# Altium footprint library Разъемы.PcbLib: 291 footprints (part 12 of 19)
Each footprint in its own frame and in the unit in brackets; x right, y up, seen from the top. Pads: shape width x height; smd on the part's side, far side on the other; paste and mask are expansions set on the pad; w line width, h text height; cw(c..) or ccw(c..) is an arc to the next point about the centre after c.
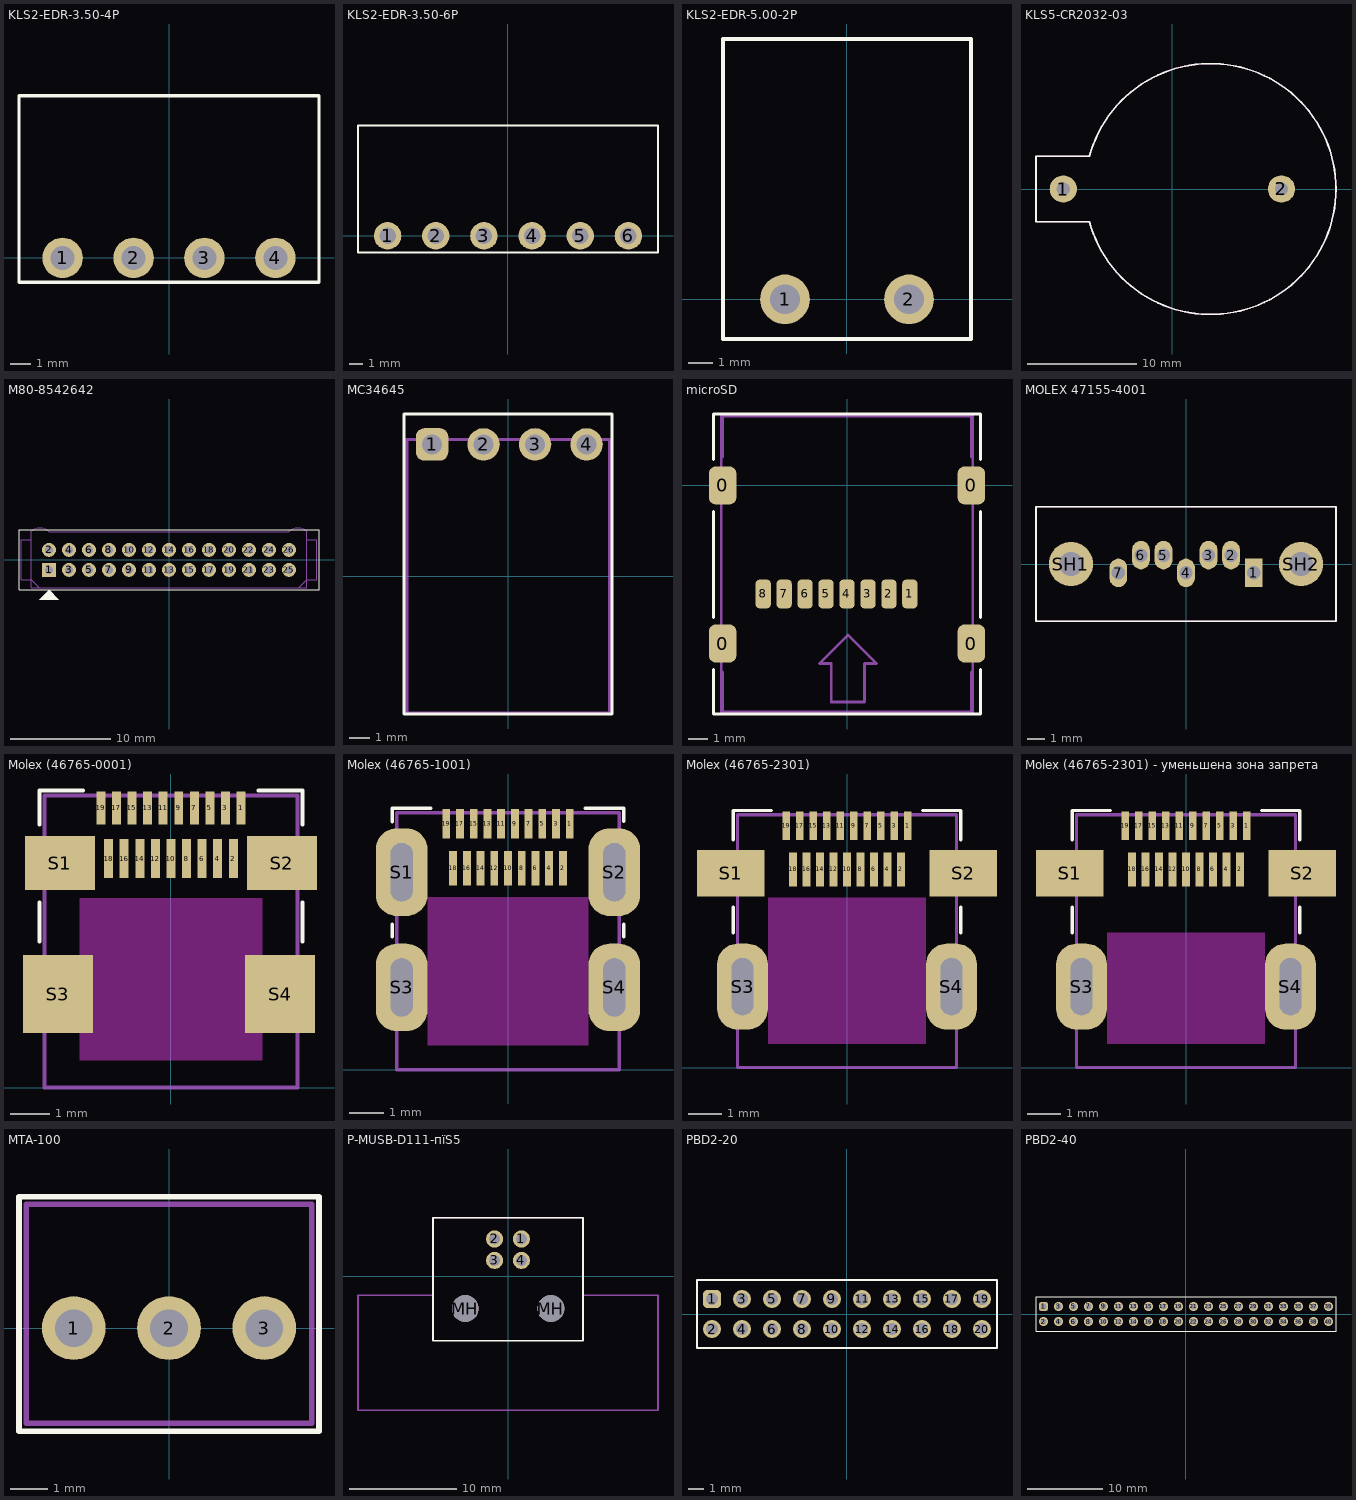
[diagram p11: the footprints below, top view; thin cyan lines are the x and y axes]

## KLS2-EDR-3.50-4P [mm]
pads (4):
  round 2 hole 1.2: 1(-5.25,0) 2(-1.75,0) 3(1.75,0) 4(5.25,0)
Top Overlay:
  lines w0.15: -7.4,-1.2 -7.4,8 -7,8 7.4,8 7.4,-1.2 -7,-1.2 -7.4,-1.2
3D body: height 7, standoff 0, extent -7.4,-1.2 7.4,8

## KLS2-EDR-3.50-6P [mm]
pads (6):
  round 2 hole 1.2: 1(-8.75,0) 2(-5.25,0) 3(-1.75,0) 4(1.75,0) 5(5.25,0) 6(8.75,0)
Top Overlay:
  lines w0.15: 10.85,-1.2 -7,-1.2 -10.9,-1.2 -10.9,8 -7,8 10.85,8 ; 10.9,-1.2 10.9,8
3D body: height 7, standoff 0, extent -10.9,-1.2 10.85,8

## KLS2-EDR-5.00-2P [mm]
pads (2):
  round 2 hole 1.2: 1(-2.5,0) 2(2.5,0)
Top Overlay:
  lines w0.15: -5,-1.6 0.4,-1.6 5,-1.6 5,10.5 -2.5,10.5 -5,10.5 -5,-1.6
3D body: height 8.2, standoff 0, extent -5,-1.6 5,10.5

## KLS5-CR2032-03 [mm]
height 6.6
pads (2):
  round 2.5 hole 1.2: 1(-10,0) 2(10,0)
Top Overlay:
  lines w0.15: -7.621,-3 -12.5,-3 -12.5,0 -12.5,3 -7.621,3 -7.595,3.026 cw(c3.5,0) -7.595,-3.026
Top Courtyard:
  lines w0.15: -7.621,-3 -12.5,-3 -12.5,0 -12.5,3 -7.621,3 -7.595,3.026 cw(c3.5,0) -7.595,-3.026
3D body: height 6, standoff 0, extent -12.5,-3 -5.5,3
3D body: height 6, standoff 0, extent -8,-11.5 15,11.5

## M80-8542642 [mm] "Harwin"
height 5.56
pads (26):
  rect 1.4x1.4 hole 0.8: 1(-12,-1)
  round 1.4 hole 0.8: 2(-12,1) 3(-10,-1) 4(-10,1) 5(-8,-1) 6(-8,1) 7(-6,-1) 8(-6,1) 9(-4,-1) 10(-4,1) 11(-2,-1) 12(-2,1) 13(0,-1) 14(0,1) 15(2,-1) 16(2,1) 17(4,-1) 18(4,1) 19(6,-1) 20(6,1) 21(8,-1) 22(8,1) 23(10,-1) 24(10,1) 25(12,-1) 26(12,1)
Top Overlay:
  region: -12,-3 -13,-4 -11,-4
  lines w0.1: -15,-3 -15,3 15,3 15,-3 -15,-3
Mechanical 1:
  lines w0.1: -13.8,2 -14.775,2 -14.775,-2 -13.8,-2 -13,-2.8 ; 13,-2.8 13.8,-2 14.775,-2 14.775,2 13.8,2 ; -13.8,-2.8 -13.8,2.8 cw(c-12.9,1.9) -12,2.8 12,2.8 cw(c12.9,1.9) 13.8,2.8 13.8,-2.8 -13.8,-2.8
3D body "M80-8542642 (Harwin).STEP": height 5.56, standoff -3, extent -14.775,-2.8 14.775,3.1

## MC34645 [mm] "MULTICOMP, Wire-To-Board Connector, 2.54 mm, 4 Contacts, Header, MC34 Series, Through Hole, 1 Rows"
height 5.8
pads (4):
  rrect50% 1.6x1.6 hole 1: 1(-3.75,6.5)
  round 1.6 hole 1: 2(-1.21,6.5) 3(1.33,6.5) 4(3.87,6.5)
Top Overlay:
  lines w0.15: -5.13,-6.8 -5.13,8 5.12,8 5.12,-6.8 -5.13,-6.8
Top Courtyard:
  lines w0.15: -5,-6.75 -5,6.75 5,6.75 5,-6.75 -5,-6.75
Top Designator:
  text ".Designator" at -4.004,0.333 h0.8
3D body "STEP-61900411021-rev1.stp": height 5.9, standoff -3.3, extent -5.02,-6.685 5.14,6.835

## microSD [mm]
height 2
pads (12):
  rrect50% 1.45x2 smd: 0(-6.53,-8.3) 0(-6.53,0) 0(6.53,-8.3) 0(6.53,0)
  rrect50% 0.8x1.5 smd: 1(3.3,-5.7) 2(2.2,-5.7) 3(1.1,-5.7) 4(0,-5.7) 5(-1.1,-5.7) 6(-2.2,-5.7) 7(-3.3,-5.7) 8(-4.4,-5.7)
Top Overlay:
  lines w0.15: -7,-9.669 -7,-12 7,-12 7,-9.669 ; -7,-6.931 -7,-1.369 ; -7,1.369 -7,3.75 7,3.75 7,1.369 ; 7,-6.931 7,-1.369
Top Designator:
  text ".Designator" at -3.999,-4.392 h0.8
Mechanical 29:
  lines w0.15: -6.53,-9.8 -6.53,-11.95 0,-11.95 6.53,-11.95 6.53,-9.8 ; -6.53,1.5 -6.53,3.65 0,3.65 6.53,3.65 6.53,1.5 ; -6.6,-11.9 6.6,-11.9 6.6,1.5 6.6,3.7 -6.6,3.7 -6.6,1.5 -6.6,-11.9 ; -1.45,-9.35 0.05,-7.85 1.55,-9.35 0.925,-9.35 0.925,-11.375 0.05,-11.375 -0.825,-11.375 -0.825,-9.35 -1.45,-9.35
  text ".Designator" at -4,-2.3 h1
3D body "User Library-473521001_microSD.step": height 2, standoff 0.12, extent -7.1,-11.915 7,3.285

## MOLEX 47155-4001 [mm] "MOLEX 47155-4001 (SATA)"
height 8.4
pads (9):
  rect 1x1.6 hole 0.75: 1(3.81,-0.5)
  oval 1x1.6 hole 0.75: 2(2.54,0.5) 3(1.27,0.5) 4(0,-0.5) 5(-1.27,0.5) 6(-2.54,0.5) 7(-3.81,-0.5)
  round 2.5 hole 1.35: SH1(-6.48,0) SH2(6.48,0)
Top Overlay:
  lines w0.1: -8.45,-3.225 -8.45,3.225 8.45,3.225 8.45,-3.225 -8.45,-3.225
Mechanical 1:
  lines w0.1: -8.45,-3.225 -8.45,3.225 8.45,3.225 8.45,-3.225 -8.45,-3.225
3D body "471554001.stp": height 8.65, standoff -2.4, extent -8.45,-3.171 8.45,3.279

## Molex (46765-0001) [mm]
height 3.05
pads (23):
  rect 0.23x0.85 smd: 1(1.8,7.175) 3(1.4,7.175) 5(1,7.175) 7(0.6,7.175) 9(0.2,7.175) 11(-0.2,7.175) 13(-0.6,7.175) 15(-1,7.175) 17(-1.4,7.175) 19(-1.8,7.175)
  rect 0.23x1 smd: 2(1.6,5.875) 4(1.2,5.875) 6(0.8,5.875) 8(0.4,5.875) 10(0,5.875) 12(-0.4,5.875) 14(-0.8,5.875) 16(-1.2,5.875) 18(-1.6,5.875)
  rect 1.8x1.38 smd: S1(-2.85,5.76) S2(2.85,5.76)
  rect 1.8x2 smd: S3(-2.9,2.4) S4(2.8,2.4)
Top Overlay:
  lines w0.1: -3.375,3.75 -3.375,4.75 ; -3.375,6.75 -3.375,7.625 -2.25,7.625 ; 2.25,7.625 3.375,7.625 3.375,6.75 ; 3.375,3.75 3.375,4.75
Keep-Out Layer:
  rectangle: -2.35,0.7 2.35,4.86
Mechanical 1:
  lines w0.1: -3.25,0 -3.25,7.5 3.25,7.5 3.25,0 -3.25,0
3D body "467650001.stp": height 2.92, standoff -0.05, extent -3.25,0 3.25,7.5

## Molex (46765-1001) [mm]
height 3.05
pads (23):
  rect 0.23x0.85 smd: 1(1.8,7.175) 3(1.4,7.175) 5(1,7.175) 7(0.6,7.175) 9(0.2,7.175) 11(-0.2,7.175) 13(-0.6,7.175) 15(-1,7.175) 17(-1.4,7.175) 19(-1.8,7.175)
  rect 0.23x1 smd: 2(1.6,5.875) 4(1.2,5.875) 6(0.8,5.875) 8(0.4,5.875) 10(0,5.875) 12(-0.4,5.875) 14(-0.8,5.875) 16(-1.2,5.875) 18(-1.6,5.875)
  rrect80% 1.5x2.55 hole 0.65 slot 1.7 at 90 deg: S1(-3.1,5.76) S2(3.1,5.76) S3(-3.1,2.4) S4(3.1,2.4)
Top Overlay:
  lines w0.1: -3.375,3.875 -3.375,4.25 ; -3.375,7.225 -3.375,7.625 -2.25,7.625 ; 2.25,7.625 3.375,7.625 3.375,7.25 ; 3.375,3.875 3.375,4.25
Keep-Out Layer:
  rectangle: -2.35,0.7 2.35,5.04
Mechanical 1:
  lines w0.1: -3.25,0 -3.25,7.5 3.25,7.5 3.25,0 -3.25,0
3D body "467651001.stp": height 2.92, standoff -0.6, extent -3.25,0 3.25,7.5

## Molex (46765-2301) [mm]
height 3.05
pads (23):
  rect 0.23x0.85 smd: 1(1.8,7.175) 3(1.4,7.175) 5(1,7.175) 7(0.6,7.175) 9(0.2,7.175) 11(-0.2,7.175) 13(-0.6,7.175) 15(-1,7.175) 17(-1.4,7.175) 19(-1.8,7.175)
  rect 0.23x1 smd: 2(1.6,5.875) 4(1.2,5.875) 6(0.8,5.875) 8(0.4,5.875) 10(0,5.875) 12(-0.4,5.875) 14(-0.8,5.875) 16(-1.2,5.875) 18(-1.6,5.875)
  rect 2x1.38 smd: S1(-3.45,5.76) S2(3.45,5.76)
  rrect80% 1.5x2.55 hole 0.65 slot 1.7 at 90 deg: S3(-3.1,2.4) S4(3.1,2.4)
Top Overlay:
  lines w0.1: -3.375,4 -3.375,4.75 ; -3.375,6.75 -3.375,7.625 -2.25,7.625 ; 2.25,7.625 3.375,7.625 3.375,6.75 ; 3.375,4 3.375,4.75
Keep-Out Layer:
  rectangle: -2.35,0.7 2.35,5.04
Mechanical 1:
  lines w0.1: -3.25,0 -3.25,7.5 3.25,7.5 3.25,0 -3.25,0
3D body "467652301.stp": height 2.92, standoff -0.6, extent -4.45,0 4.45,7.5

## Molex (46765-2301) - уменьшена зона запрета [mm]
height 3.05
pads (23):
  rect 0.23x0.85 smd: 1(1.8,7.175) 3(1.4,7.175) 5(1,7.175) 7(0.6,7.175) 9(0.2,7.175) 11(-0.2,7.175) 13(-0.6,7.175) 15(-1,7.175) 17(-1.4,7.175) 19(-1.8,7.175)
  rect 0.23x1 smd: 2(1.6,5.875) 4(1.2,5.875) 6(0.8,5.875) 8(0.4,5.875) 10(0,5.875) 12(-0.4,5.875) 14(-0.8,5.875) 16(-1.2,5.875) 18(-1.6,5.875)
  rect 2x1.38 smd: S1(-3.45,5.76) S2(3.45,5.76)
  rrect80% 1.5x2.55 hole 0.65 slot 1.7 at 90 deg: S3(-3.1,2.4) S4(3.1,2.4)
Top Overlay:
  lines w0.1: -3.375,4 -3.375,4.75 ; -3.375,6.75 -3.375,7.625 -2.25,7.625 ; 2.25,7.625 3.375,7.625 3.375,6.75 ; 3.375,4 3.375,4.75
Keep-Out Layer:
  rectangle: -2.35,0.7 2.35,4
Mechanical 1:
  lines w0.1: -3.25,0 -3.25,7.5 3.25,7.5 3.25,0 -3.25,0
3D body "467652301.stp": height 2.92, standoff -0.6, extent -4.45,0 4.45,7.5

## MTA-100 [mm] "MTA-100 3 pins"
height 10
pads (3):
  round 1.7 hole 1: 1(-2.54,0) 2(0,0) 3(2.54,0)
Top Overlay:
  lines w0.15: -4,-2.75 4,-2.75 4,3.5 -4,3.5 -4,-2.75
Top Designator:
  text ".Designator" at -3.719,0.114 h0.8
Mechanical 29:
  lines w0.15: -3.81,-2.54 3.81,-2.54 ; -3.81,-2.54 -3.81,3.302 ; -3.81,-2.54 3.81,-2.54 ; -3.81,-2.54 -3.81,3.302 ; -3.81,3.302 3.81,3.302 ; -3.81,3.302 3.81,3.302 ; 3.81,-2.54 3.81,3.302 ; 3.81,-2.54 3.81,3.302
  text ".Designator" at -3,0.2 h1

## P-MUSB-D111-пїЅ5 [mm]
height 13
pads (6):
  round 1.6 hole 1: 1(1.25,3.5) 2(-1.25,3.5) 3(-1.25,1.5) 4(1.25,1.5)
  round 2.5 hole 2.5 unplated: MH(-4,-2.99) MH(4,-2.99)
Top Overlay:
  lines w0.15: -7,-6 -7,5.5 0,5.5 7,5.5 7,-6 0,-6 -7,-6
Top Courtyard:
  lines w0.15: -14,-12.5 0,-12.5 14,-12.5 14,-1.74 7,-1.74 7,5.5 0,5.5 -7,5.5 -7,-1.74 -14,-1.74 -14,-12.5
Top Designator:
  text ".Designator" at -3.999,-3.767 h0.8
3D body "P-MUSB-D111-�5.STEP": height 15.6, standoff -2.65, extent -14,-12.5 14,5.5

## PBD2-20 [mm]
pads (20):
  rrect50% 1.2x1.2 hole 0.8: 1(-9,1)
  round 1.2 hole 0.8: 2(-9,-1) 3(-7,1) 4(-7,-1) 5(-5,1) 6(-5,-1) 7(-3,1) 8(-3,-1) 9(-1,1) 10(-1,-1) 11(1,1) 12(1,-1) 13(3,1) 14(3,-1) 15(5,1) 16(5,-1) 17(7,1) 18(7,-1) 19(9,1) 20(9,-1)
Top Overlay:
  lines w0.15: -10,-2.27 10,-2.27 10,2.27 -10,2.27 -10,-2.27
  text "." at -10.5,1.5 h0.1
3D body: height 4.3, standoff 0, extent -10,-2 10,2
3D body: height 1, standoff -3, extent -9.25,0.75 -8.75,1.25
3D body: height 1, standoff -3, extent -9.25,-1.25 -8.75,-0.75
3D body: height 1, standoff -3, extent -7.25,0.75 -6.75,1.25
3D body: height 1, standoff -3, extent -7.25,-1.25 -6.75,-0.75
3D body: height 1, standoff -3, extent -5.25,0.75 -4.75,1.25
3D body: height 1, standoff -3, extent -5.25,-1.25 -4.75,-0.75
3D body: height 1, standoff -3, extent -3.25,0.75 -2.75,1.25
3D body: height 1, standoff -3, extent -3.25,-1.25 -2.75,-0.75
3D body: height 1, standoff -3, extent -1.25,0.75 -0.75,1.25
3D body: height 1, standoff -3, extent -1.25,-1.25 -0.75,-0.75
3D body: height 1, standoff -3, extent 0.75,0.75 1.25,1.25
3D body: height 1, standoff -3, extent 0.75,-1.25 1.25,-0.75
3D body: height 1, standoff -3, extent 2.75,0.75 3.25,1.25
3D body: height 1, standoff -3, extent 2.75,-1.25 3.25,-0.75
3D body: height 1, standoff -3, extent 4.75,0.75 5.25,1.25
3D body: height 1, standoff -3, extent 4.75,-1.25 5.25,-0.75
3D body: height 1, standoff -3, extent 6.75,0.75 7.25,1.25
3D body: height 1, standoff -3, extent 6.75,-1.25 7.25,-0.75
3D body: height 1, standoff -3, extent 8.75,0.75 9.25,1.25
3D body: height 1, standoff -3, extent 8.75,-1.25 9.25,-0.75

## PBD2-40 [mm]
pads (40):
  rrect50% 1.2x1.2 hole 0.8: 1(-19,1)
  round 1.2 hole 0.8: 2(-19,-1) 3(-17,1) 4(-17,-1) 5(-15,1) 6(-15,-1) 7(-13,1) 8(-13,-1) 9(-11,1) 10(-11,-1) 11(-9,1) 12(-9,-1) 13(-7,1) 14(-7,-1) 15(-5,1) 16(-5,-1) 17(-3,1) 18(-3,-1) 19(-1,1) 20(-1,-1) 21(1,1) 22(1,-1) 23(3,1) 24(3,-1) 25(5,1) 26(5,-1) 27(7,1) 28(7,-1) 29(9,1) 30(9,-1) 31(11,1) 32(11,-1) 33(13,1) 34(13,-1) 35(15,1) 36(15,-1) 37(17,1) 38(17,-1) 39(19,1) 40(19,-1)
Top Overlay:
  lines w0.15: -20,-2.27 -20,2.27 20,2.27 20,-2.27 -20,-2.27
  text "." at -20.5,1.5 h0.1
3D body: height 1, standoff -3, extent -1.25,-1.25 -0.75,-0.75
3D body: height 1, standoff -3, extent -1.25,0.75 -0.75,1.25
3D body: height 1, standoff -3, extent -3.25,-1.25 -2.75,-0.75
3D body: height 1, standoff -3, extent -3.25,0.75 -2.75,1.25
3D body: height 1, standoff -3, extent -5.25,-1.25 -4.75,-0.75
3D body: height 1, standoff -3, extent -5.25,0.75 -4.75,1.25
3D body: height 1, standoff -3, extent -7.25,-1.25 -6.75,-0.75
3D body: height 1, standoff -3, extent -7.25,0.75 -6.75,1.25
3D body: height 1, standoff -3, extent -9.25,-1.25 -8.75,-0.75
3D body: height 1, standoff -3, extent -9.25,0.75 -8.75,1.25
3D body: height 1, standoff -3, extent -11.25,-1.25 -10.75,-0.75
3D body: height 1, standoff -3, extent -11.25,0.75 -10.75,1.25
3D body: height 1, standoff -3, extent -13.25,-1.25 -12.75,-0.75
3D body: height 1, standoff -3, extent -13.25,0.75 -12.75,1.25
3D body: height 1, standoff -3, extent -15.25,-1.25 -14.75,-0.75
3D body: height 1, standoff -3, extent -15.25,0.75 -14.75,1.25
3D body: height 1, standoff -3, extent -17.25,-1.25 -16.75,-0.75
3D body: height 1, standoff -3, extent -17.25,0.75 -16.75,1.25
3D body: height 1, standoff -3, extent -19.25,-1.25 -18.75,-0.75
3D body: height 1, standoff -3, extent -19.25,0.75 -18.75,1.25
3D body: height 4.3, standoff 0, extent -20,-2 20,2
3D body: height 1, standoff -3, extent 18.75,-1.25 19.25,-0.75
3D body: height 1, standoff -3, extent 18.75,0.75 19.25,1.25
3D body: height 1, standoff -3, extent 16.75,-1.25 17.25,-0.75
3D body: height 1, standoff -3, extent 16.75,0.75 17.25,1.25
3D body: height 1, standoff -3, extent 14.75,-1.25 15.25,-0.75
3D body: height 1, standoff -3, extent 14.75,0.75 15.25,1.25
3D body: height 1, standoff -3, extent 12.75,-1.25 13.25,-0.75
3D body: height 1, standoff -3, extent 12.75,0.75 13.25,1.25
3D body: height 1, standoff -3, extent 10.75,-1.25 11.25,-0.75
3D body: height 1, standoff -3, extent 10.75,0.75 11.25,1.25
3D body: height 1, standoff -3, extent 8.75,-1.25 9.25,-0.75
3D body: height 1, standoff -3, extent 8.75,0.75 9.25,1.25
3D body: height 1, standoff -3, extent 6.75,-1.25 7.25,-0.75
3D body: height 1, standoff -3, extent 6.75,0.75 7.25,1.25
3D body: height 1, standoff -3, extent 4.75,-1.25 5.25,-0.75
3D body: height 1, standoff -3, extent 4.75,0.75 5.25,1.25
3D body: height 1, standoff -3, extent 2.75,-1.25 3.25,-0.75
3D body: height 1, standoff -3, extent 2.75,0.75 3.25,1.25
3D body: height 1, standoff -3, extent 0.75,-1.25 1.25,-0.75
3D body: height 1, standoff -3, extent 0.75,0.75 1.25,1.25